# Altium footprint library MYS-Library.PcbLib: 94 footprints (part 1 of 6)
Each footprint in its own frame and in the unit in brackets; x right, y up, seen from the top. Pads: shape width x height; smd on the part's side, far side on the other; paste and mask are expansions set on the pad; w line width, h text height; cw(c..) or ccw(c..) is an arc to the next point about the centre after c.
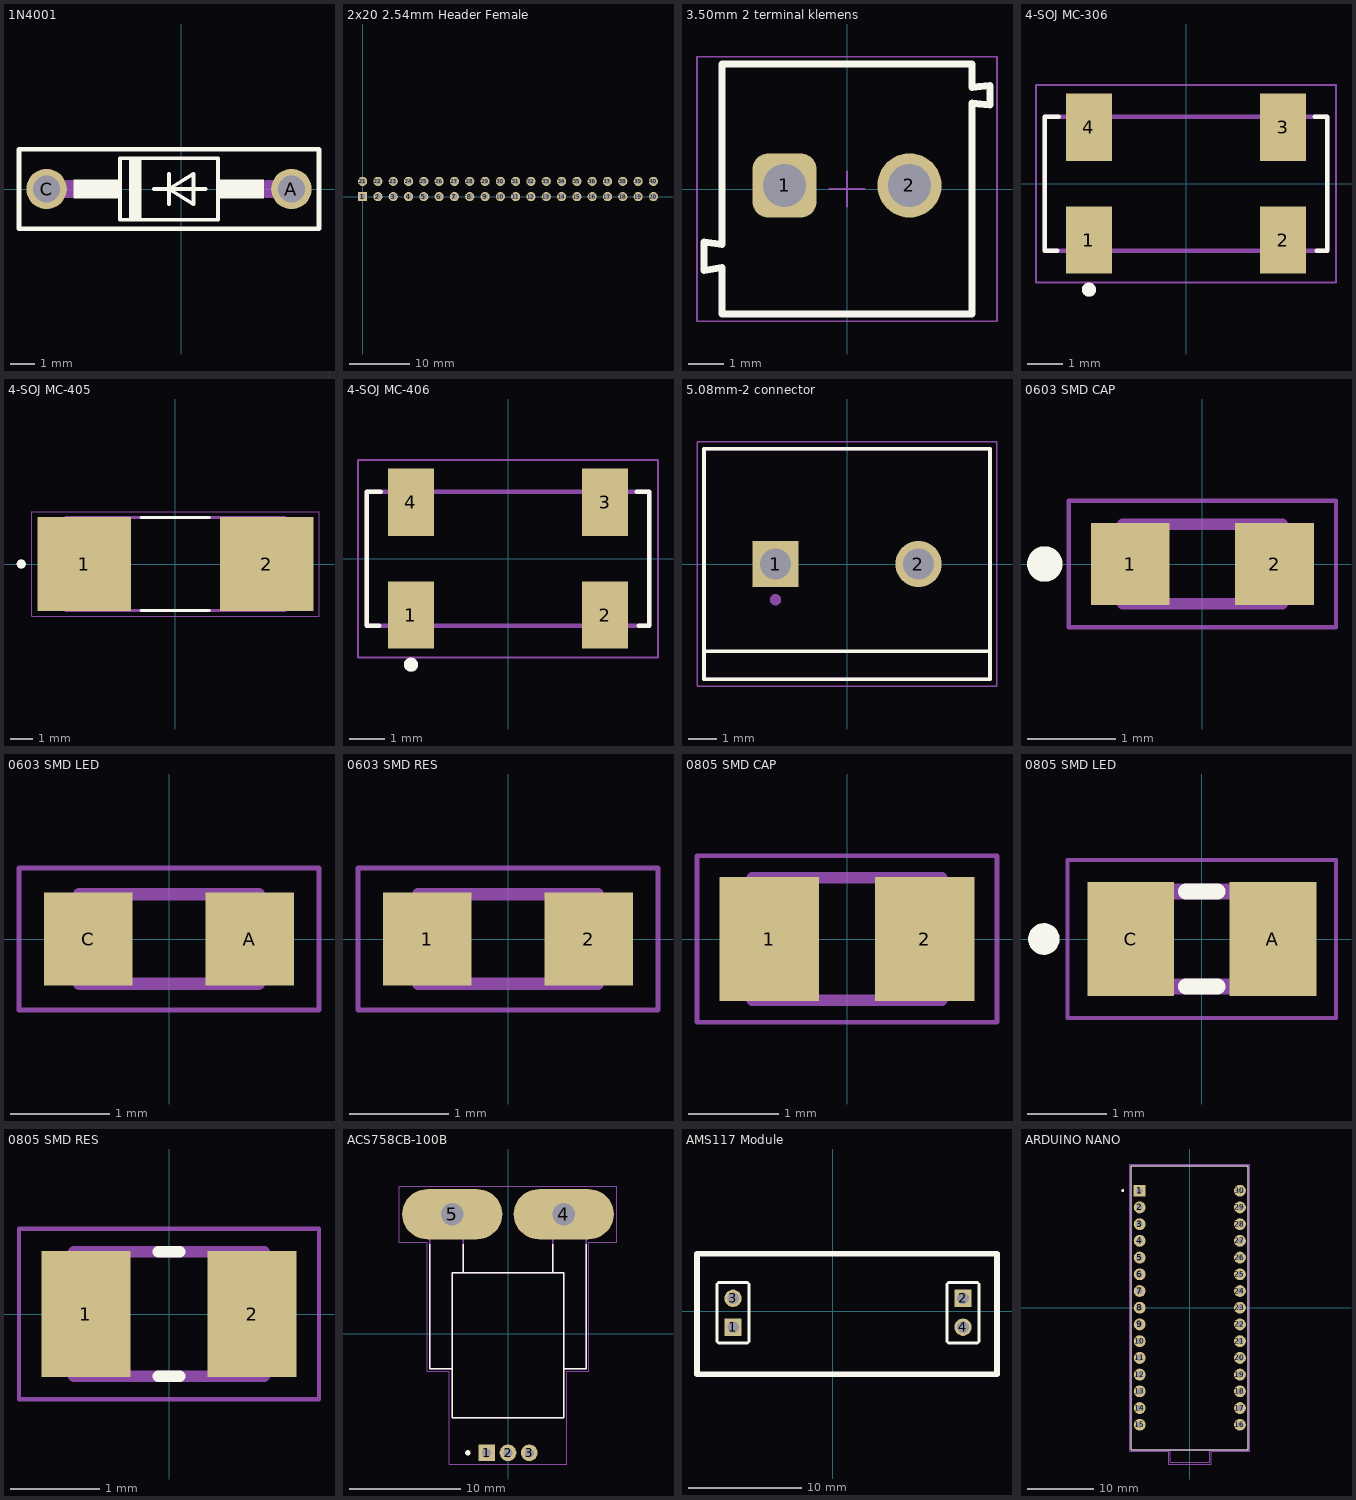
[diagram p0: the footprints below, top view; thin cyan lines are the x and y axes]

## 1N4001 [mil]
pads (2):
  round 66 hole 44: A(180,0) C(-220,0)
Top Overlay:
  region: -65,-50.06 -85.07,-50.06 -85.07,50 -65,50
  region: 135,-15.03 60.13,-15.03 60.13,15 135,15
  region: -100,-15.02 -175.2,-15.02 -175.2,15 -100,15
  lines w6: -45,0 -20,0 ; -20,-25 -20,0 ; -20,25 -20,0 ; 40,0 -20,0 ; -20,0 20,-25 20,25 -20,0 ; -100,-50 60,-50 60,50 -100,50 -100,-50
  lines w7.87: -265,-65 225,-65 225,65 -265,65 -265,-65
Mechanical 13:
  lines w30: -220,0 -180,0 ; 140,0 180,0
3D body "step_temp.STEP": height 106, standoff -857, extent -235.5,-53 195.5,53

## 2x20 2.54mm Header Female [mil]
pads (40):
  rect 60x60 hole 40.16: 1(0,0)
  round 60 hole 40.16: 2(100,0) 3(200,0) 4(300,0) 5(400,0) 6(500,0) 7(600,0) 8(700,0) 9(800,0) 10(900,0) 11(1000,0) 12(1100,0) 13(1200,0) 14(1300,0) 15(1400,0) 16(1500,0) 17(1600,0) 18(1700,0) 19(1800,0) 20(1900,0) 21(0,100) 22(100,100) 23(200,100) 24(300,100) 25(400,100) 26(500,100) 27(600,100) 28(700,100) 29(800,100) 30(900,100) 31(1000,100) 32(1100,100) 33(1200,100) 34(1300,100) 35(1400,100) 36(1500,100) 37(1600,100) 38(1700,100) 39(1800,100) 40(1900,100)
3D body "2x20 Stacking Header.step": height 338.98, standoff -224.02, extent -58.78,-50 1968.78,150

## 3.50mm 2 terminal klemens [mm]
pads (2):
  rrect50% 1.8x1.8 hole 1.2: 1(-1.75,0.1)
  round 1.8 hole 1.2: 2(1.75,0.1)
Top Overlay:
  lines w0.2: -3.5,-1.55 -3.5,3.5 3.5,3.5 3.5,2.85 4,2.899 4,2.35 ; -3.499,-1.55 -4,-1.48 -4,-2.278 -3.5,-2.2 -3.5,-3.5 3.5,-3.5 3.5,2.4 4,2.351
Top 3D Body:
  lines w0.1: -3.5,-1.55 -3.5,3.5 3.5,3.5 3.5,2.85 4,2.899 4,2.35 ; -3.499,-1.55 -4,-1.48 -4,-2.278 -3.5,-2.2 -3.5,-3.5 3.5,-3.5 3.5,2.4 4,2.351
Top Designator:
  text ".Designator" at -7.244,4.961 h1.5
Top Courtyard:
  lines w0.05: -4.2,-3.7 -4.2,3.7 4.2,3.7 4.2,-3.7 -4.2,-3.7
Top Component Outline:
  lines w0.1: -3.5,-1.55 -3.5,3.5 3.5,3.5 3.5,2.85 4,2.899 4,2.35 ; -3.499,-1.55 -4,-1.48 -4,-2.278 -3.5,-2.2 -3.5,-3.5 3.5,-3.5 3.5,2.4 4,2.351
Top Component Center:
  lines w0.05: -0.5,0 0.5,0 ; 0,-0.5 0,0.5
3D body "Download_STP_691214110002_rev1.stp": height 8.5, standoff -3.7, extent -3.844,-3.175 3.556,4.225

## 4-SOJ MC-306 [mm] "32.768 kHz ±100ppm Crystal 12.5pF 35 kOhms 4-SOJ, 5.50mm pitch"
pads (4):
  rect 1.3x1.9 smd: 1(-2.75,-1.6) 2(2.75,-1.6) 3(2.75,1.6) 4(-2.75,1.6)
Top Overlay:
  circle w0.2: c-2.75,-3 r0.1
  lines w0.127: -3.65,-1.9 -4,-1.9 -4,1.9 -3.6,1.9 ; 3.65,1.9 4,1.9 4,-1.9 3.7,-1.9
Mechanical 13:
  circle w0.2: c-2.75,-3 r0.1
  lines w0.127: -4,-1.9 4,-1.9 4,1.9 -4,1.9 -4,-1.9
Mechanical 15:
  lines w0.05: -4.25,-2.8 4.25,-2.8 4.25,2.8 -4.25,2.8 -4.25,-2.8
3D body "MC-306 32.7680K-A_ ROHS.STEP": height 2.54, standoff 0, extent -4,-1.85 4,1.85

## 4-SOJ MC-405 [mm] "32.768 kHz ±20ppm Crystal 12.5pF 50 kOhms 4-SOJ, 2.29mm pitch"
pads (2):
  rect 4.1x4.1 smd: 1(-4,0) 2(4,0)
Top Overlay:
  circle w0.2: c-6.75,0 r0.1
  lines w0.127: -1.5,-2.03 1.5,-2.03 ; -1.5,2.03 1.5,2.03
Mechanical 13:
  circle w0.2: c-6.75,0 r0.1
  lines w0.127: -4.8,-2.03 -4.8,2.03 4.8,2.03 4.8,-2.03 -4.8,-2.03
Mechanical 15:
  lines w0.05: -6.3,-2.3 -6.3,2.3 6.3,2.3 6.3,-2.3 -6.3,-2.3
3D body "MC-405 32.7680K-A0_ROHS.STEP": height 3.6, standoff 0, extent -5.205,-2.03 5.205,2.03

## 4-SOJ MC-406 [mm] "32.768 kHz ±20ppm Crystal 12.5pF 50 kOhms 4-SOJ, 2.29mm pitch / (mm) 8.00x3.80x2.50"
pads (4):
  rect 1.3x1.9 smd: 1(-2.75,-1.6) 2(2.75,-1.6) 3(2.75,1.6) 4(-2.75,1.6)
Top Overlay:
  circle w0.2: c-2.75,-3 r0.1
  lines w0.127: -3.65,-1.9 -4,-1.9 -4,1.9 -3.6,1.9 ; 3.65,1.9 4,1.9 4,-1.9 3.7,-1.9
Mechanical 13:
  circle w0.2: c-2.75,-3 r0.1
  lines w0.127: -4,-1.9 -4,1.9 4,1.9 4,-1.9 -4,-1.9
Mechanical 15:
  lines w0.05: -4.25,-2.8 -4.25,2.8 4.25,2.8 4.25,-2.8 -4.25,-2.8
3D body "ABS25-32.768KHZ-T--3DModel-STEP-400430.STEP": height 2.65, standoff -0.01, extent -4,-2 4,2

## 5.08mm-2 connector [mm] "Klemens 5.08mm"
pads (2):
  rect 1.65x1.65 hole 1.1: 1(-2.54,0)
  round 1.65 hole 1.1: 2(2.54,0)
Top Overlay:
  lines w0.127: -5.08,-3.1 5.08,-3.1 ; -5.08,-3.1 -5.08,4.1 5.08,4.1 5.08,-3.1 ; -5.08,-3.1 -5.08,-4.1 5.08,-4.1 5.08,-3.1
Mechanical 13:
  circle w0.2: c-2.54,-1.27 r0.1
  lines w0.127: -5.08,-4.1 -5.08,4.1 5.08,4.1 5.08,-4.1 -5.08,-4.1
Mechanical 15:
  lines w0.05: -5.33,-4.35 -5.33,4.35 5.33,4.35 5.33,-4.35 -5.33,-4.35
3D body "282837-2--3DModel-STEP-1.STEP": height 10.02, standoff -3.48, extent -5.761,-4.136 4.999,4.064

## 0603 SMD CAP [mm]
pads (2):
  rect 0.89x0.93 smd: 1(-0.814,0) 2(0.814,0)
Top Overlay:
  circle w0.2: c-1.778,0 r0.1
Mechanical 13:
  lines w0.127: -0.9,-0.45 0.9,-0.45 0.9,0.45 -0.9,0.45 -0.9,-0.45
Mechanical 15:
  lines w0.05: -1.508,-0.715 1.508,-0.715 1.508,0.715 -1.508,0.715 -1.508,-0.715
3D body "Ceramic_Capacitor_0603_h32mil.step": height 0.81, standoff 0.01, extent -0.8,-0.4 0.8,0.4

## 0603 SMD LED [mm]
pads (2):
  rect 0.89x0.93 smd: A(0.814,0) C(-0.814,0)
Mechanical 13:
  lines w0.127: -0.9,-0.45 0.9,-0.45 0.9,0.45 -0.9,0.45 -0.9,-0.45
Mechanical 15:
  lines w0.05: -1.508,-0.715 1.508,-0.715 1.508,0.715 -1.508,0.715 -1.508,-0.715
3D body "WL-SMCW SMT LED WURTH ELEKTRONIK 0603.step": height 0.7, standoff 0, extent -0.8,-0.35 0.8,0.35

## 0603 SMD RES [mm]
pads (2):
  rect 0.89x0.93 smd: 1(-0.814,0) 2(0.814,0)
Mechanical 13:
  lines w0.127: -0.9,-0.45 0.9,-0.45 0.9,0.45 -0.9,0.45 -0.9,-0.45
Mechanical 15:
  lines w0.05: -1.508,-0.715 1.508,-0.715 1.508,0.715 -1.508,0.715 -1.508,-0.715
3D body "RC0603JR-070RL--3DModel-STEP-510211.STEP": height 0.55, standoff 0, extent -0.8,-0.4 0.8,0.4

## 0805 SMD CAP [mm]
pads (2):
  rect 1.1x1.38 smd: 1(-0.863,0) 2(0.863,0)
Mechanical 13:
  lines w0.127: -1.05,-0.68 -1.05,0.68 1.05,0.68 1.05,-0.68 -1.05,-0.68
Mechanical 15:
  lines w0.05: -1.665,-0.925 -1.665,0.925 1.665,0.925 1.665,-0.925 -1.665,-0.925
3D body "GRM21BR61A106KE19L.STEP": height 1.22, standoff -0.03, extent -1,-0.725 1,0.725

## 0805 SMD LED [mm]
pads (2):
  rect 1.1x1.45 smd: A(0.9,0) C(-0.9,0)
Top Overlay:
  circle w0.2: c-2,0 r0.1
  lines w0.2: -0.2,-0.6 0.2,-0.6 ; -0.2,0.6 0.2,0.6
Mechanical 13:
  region: -0.5,-0.6 -1,-0.6 -1,0.6 -0.5,0.6
  region: 1,-0.6 0.5,-0.6 0.5,0.6 1,0.6
  lines w0.2: -1,-0.6 1,-0.6 1,0.6 -1,0.6 -1,-0.6
Mechanical 15:
  lines w0.05: -1.7,-1 1.7,-1 1.7,1 -1.7,1 -1.7,-1
3D body "step_temp.STEP": height 0.7, standoff 0, extent -1,-0.625 1,0.625

## 0805 SMD RES [mm]
pads (2):
  rect 1x1.42 smd: 1(-0.935,0) 2(0.935,0)
Top Overlay:
  lines w0.127: -0.12,-0.7 0.12,-0.7 ; -0.12,0.7 0.12,0.7
Mechanical 13:
  lines w0.127: -1.07,-0.7 1.07,-0.7 1.07,0.7 -1.07,0.7 -1.07,-0.7
Mechanical 15:
  lines w0.05: -1.685,-0.96 1.685,-0.96 1.685,0.96 -1.685,0.96 -1.685,-0.96
3D body "CR0805-JW-221ELF.STEP": height 0.6, standoff 0, extent -1,-0.625 1,0.625

## ACS758CB-100B [mm] "PFF"
pads (5):
  rect 1.5x1.5 hole 0.8: 1(-1.91,-10.7)
  round 1.5 hole 0.8: 2(0,-10.7) 3(1.91,-10.7)
  oval 9x4.5 hole 2: 4(5,10.7) 5(-5,10.7)
Top Overlay:
  circle w0.24: c-3.6,-10.7 r0.12
  lines w0.127: -7,8 -7,-3.15 -5,-3.15 ; -4,8 -4,5.45 ; 4,8 4,5.45 ; 7,8 7,-3.15 5,-3.15 ; -5,-3.15 -5,-7.55 5,-7.55 5,-3.15 ; -5,-3.15 -5,5.45 -4,5.45 ; -4,5.45 4,5.45 ; 4,5.45 5,5.45 5,-3.15
Mechanical 1:
  lines w0: -5,11.7 -4.95,11.7 ; 5,11.7 5.05,11.7 ; -7,9.7 cw(c-7,10.7) -7,11.7 -3,11.7 cw(c-3,10.7) -3,9.7 -7,9.7 ; 3,9.7 cw(c3,10.7) 3,11.7 7,11.7 cw(c7,10.7) 7,9.7 3,9.7
Mechanical 13:
  lines w0.127: -5,-3.15 -5,-7.55 5,-7.55 5,-3.15 ; -5,-3.15 -5,5.45 -4,5.45 ; -5,-3.15 -7,-3.15 -7,11.45 -4,11.45 -4,5.45 ; -4,5.45 4,5.45 ; 4,5.45 5,5.45 5,-3.15 ; 4,5.45 4,11.45 7,11.45 7,-3.15 5,-3.15
Mechanical 15:
  lines w0.05: -9.75,8.2 -7.25,8.2 -7.25,-3.4 -5.25,-3.4 -5.25,-11.7 5.25,-11.7 5.25,-3.4 7.25,-3.4 7.25,8.2 9.75,8.2 9.75,13.2 -9.75,13.2 -9.75,8.2
3D body "ACS758LCB-100B-PFF-T--3DModel-STEP-56544.STEP": height 8, standoff -3.7, extent -7.127,-11.28 6.873,11.323

## AMS117 Module [mil]
pads (4):
  rect 60x60 hole 40.16: 1(-345,-55) 2(452.24,45)
  round 60 hole 40.16: 3(-345,45) 4(452.24,-55)
Top Overlay:
  lines w10: -400,-105 -400,95 ; -395,-110 -295,-110 ; -395,100 -295,100 ; -290,-105 -290,95 ; 397.24,-105 397.24,95 ; 402.24,-110 502.24,-110 ; 402.24,100 502.24,100 ; 507.24,-105 507.24,95
  lines w19.68: -470,-218.7 570,-218.7 570,200 -470,200 -470,-218.7
3D body "885012207128.STEP": height 359.25, standoff 310.04, extent -214.37,-169.61 -135.63,-120.39
3D body "885012207128.STEP": height 359.25, standoff 310.04, extent 260.63,-174.61 339.37,-125.39
3D body "AMS1117.STEP": height 385.96, standoff 314.96, extent -78,-107.75 178,167.75
3D body "zl201-2_p2-54_l5-08_w2-54_h8-89.stp": height 395.59, standoff -74.41, extent 405,-105 505,95
3D body "zl201-2_p2-54_l5-08_w2-54_h8-89.stp": height 395.59, standoff -74.41, extent -396.56,-103.87 -296.56,96.13
3D body "885012207128.STEP": height 359.25, standoff 310.04, extent -239.61,-34.37 -190.39,44.37
3D body "885012207128.STEP": height 359.25, standoff 310.04, extent -159.61,-34.37 -110.39,44.37
3D body "885012207128.STEP": height 359.25, standoff 310.04, extent 220.39,-29.37 269.61,49.37
3D body "885012207128.STEP": height 359.25, standoff 310.04, extent 300.39,-29.37 349.61,49.37
3D body: height 314.96, standoff 275.59, extent -450,-200 550,180

## ARDUINO NANO [mm]
pads (30):
  rect 1.8x1.8 / inner round 1.8 / far side rect 1.8x1.8 hole 0.9: 1(-7.62,17.78)
  round 1.8 hole 0.9: 2(-7.62,15.24) 3(-7.62,12.7) 4(-7.62,10.16) 5(-7.62,7.62) 6(-7.62,5.08) 7(-7.62,2.54) 8(-7.62,0) 9(-7.62,-2.54) 10(-7.62,-5.08) 11(-7.62,-7.62) 12(-7.62,-10.16) 13(-7.62,-12.7) 14(-7.62,-15.24) 15(-7.62,-17.78) 16(7.62,-17.78) 17(7.62,-15.24) 18(7.62,-12.7) 19(7.62,-10.16) 20(7.62,-7.62) 21(7.62,-5.08) 22(7.62,-2.54) 23(7.62,0) 24(7.62,2.54) 25(7.62,5.08) 26(7.62,7.62) 27(7.62,10.16) 28(7.62,12.7) 29(7.62,15.24) 30(7.62,17.78)
Top Overlay:
  circle w0.2: c-10.2,17.8 r0.1
  lines w0.127: -8.89,-21.59 8.89,-21.59 8.89,21.59 -8.89,21.59 -8.89,-21.59
Mechanical 13:
  circle w0.2: c-10.2,17.8 r0.1
  lines w0.127: -2.97,-21.59 3,-21.59 ; -2.97,-21.59 -8.89,-21.59 -8.89,21.59 8.89,21.59 8.89,-21.59 3,-21.59 ; -2.97,-21.59 -2.97,-23.495 3,-23.495 3,-21.59
Mechanical 15:
  lines w0.05: -9.14,-21.84 -9.14,21.84 9.14,21.84 9.14,-21.84 3.25,-21.84 3.25,-23.745 -3.22,-23.745 -3.22,-21.84 -9.14,-21.84
3D body "step_temp.STEP": height 12.6, standoff -6, extent -9,-21.6 9,23.4